# Altium footprint library main.PcbLib: 208 footprints (part 5 of 13)
Each footprint in its own frame and in the unit in brackets; x right, y up, seen from the top. Pads: shape width x height; smd on the part's side, far side on the other; paste and mask are expansions set on the pad; w line width, h text height; cw(c..) or ccw(c..) is an arc to the next point about the centre after c.
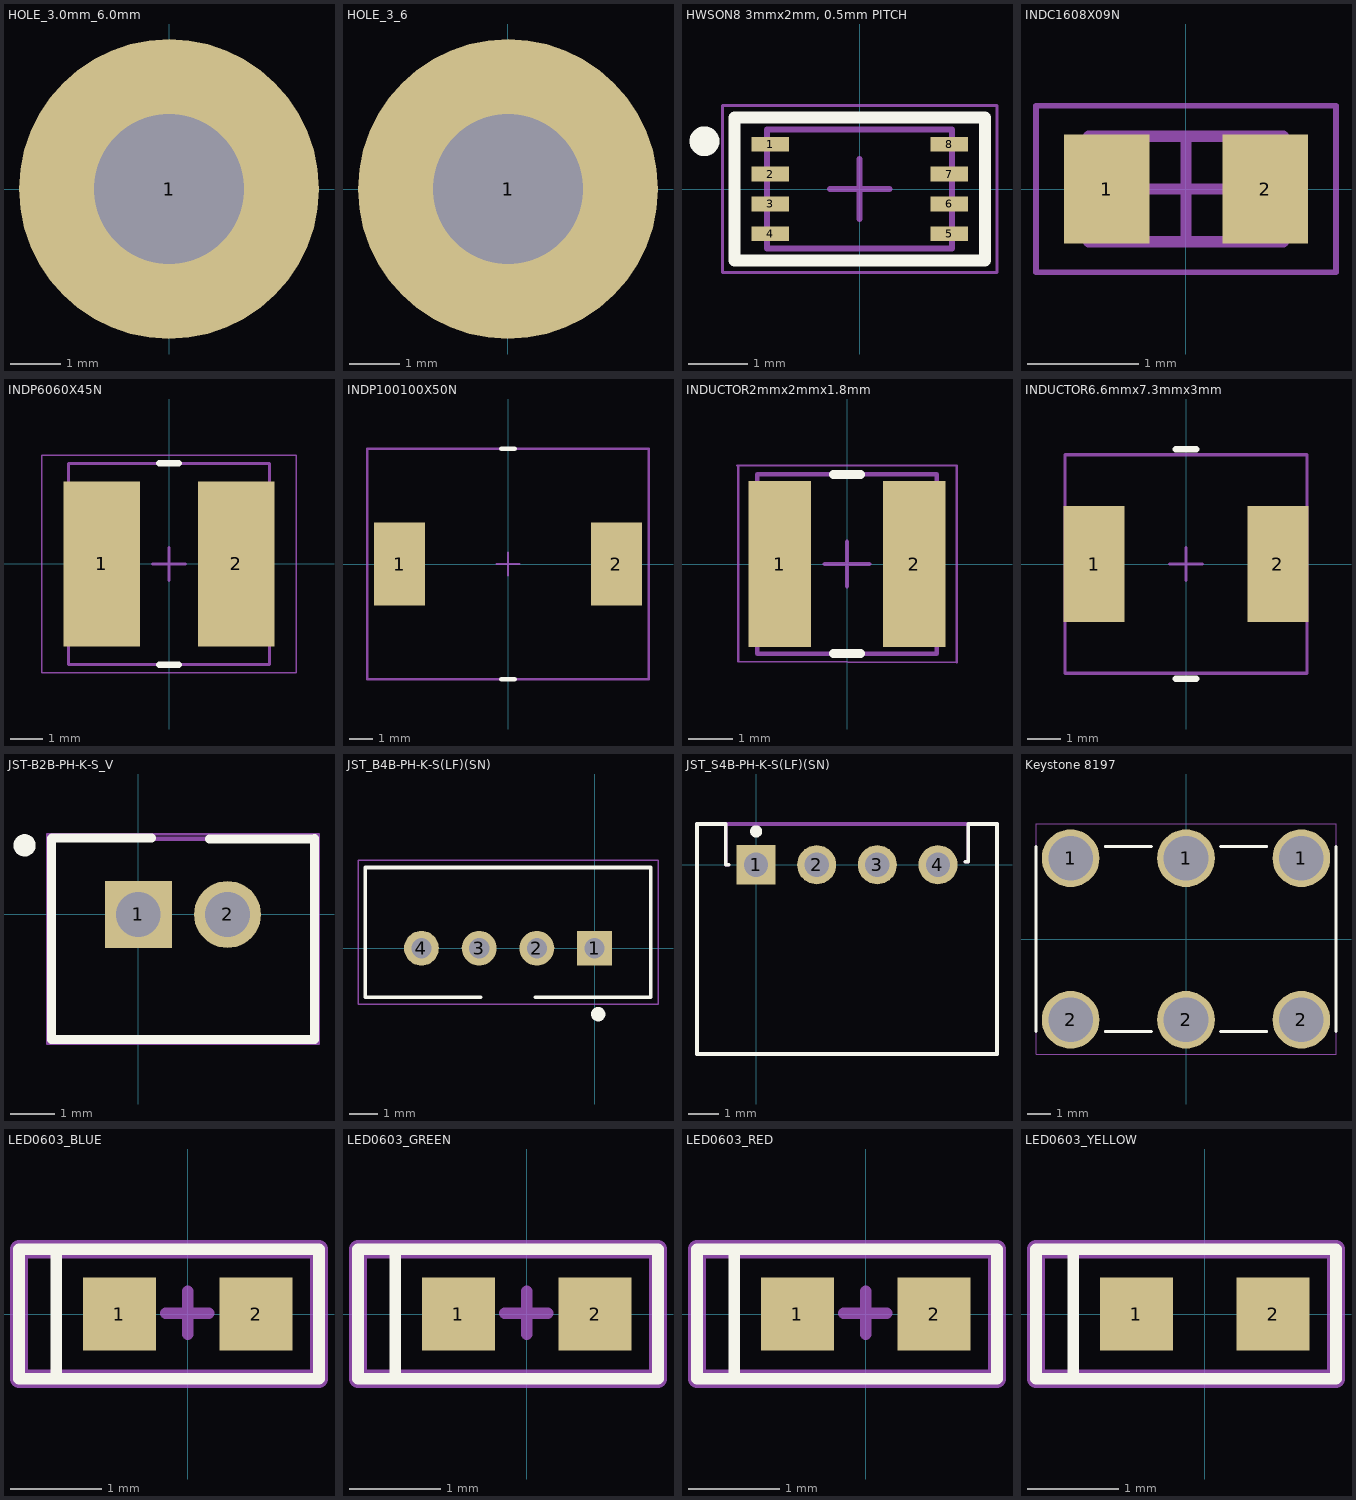
[diagram p4: the footprints below, top view; thin cyan lines are the x and y axes]

## HOLE_3.0mm_6.0mm [mm] "Plated M3 mounting hole"
pads (1):
  round 6 hole 3: 1(0,0)

## HOLE_3_6 [mm] "3 ID / 6 OD"
pads (1):
  round 6 hole 3: 1(0,0)

## HWSON8 3mmx2mm, 0.5mm PITCH [mm] "HWSON8 3mmx2mm, 0.5mm PITCH"
height 1.1
pads (8):
  rect 0.625x0.25 smd: 1(-1.5,0.75) 2(-1.5,0.25) 3(-1.5,-0.25) 4(-1.5,-0.75) 5(1.5,-0.75) 6(1.5,-0.25) 7(1.5,0.25) 8(1.5,0.75)
Top Overlay:
  circle w0.25: c-2.6,0.8 r0.125
  lines w0.2: -2.1,-1.2 2.1,-1.2 2.1,1.2 -2.1,1.2 -2.1,-1.2
Mechanical 7:
  text ".Designator" at -1.7,-0.7 h1.52
Mechanical 13:
  lines w0.1: -1.55,-1 1.55,-1 1.55,1 -1.55,1 -1.55,-1
Mechanical 15:
  lines w0.05: -2.3,-1.4 2.3,-1.4 2.3,1.4 -2.3,1.4 -2.3,-1.4
  lines w0.1: -0.5,0 0.5,0 ; 0,-0.5 0,0.5
3D body "User Library-HWSON8-2x3x0_80.STEP": height 0.75, standoff -0.05, extent -1.5,-1 1.5,1

## INDC1608X09N [mm] "Chip Inductor, 2-Leads, Body 1.60x0.80mm, IPC Medium Density"
height 0.95
pads (2):
  rect 0.77x0.98 smd: 1(-0.715,0) 2(0.715,0)
Mechanical 7:
  text ".Designator" at -1.15,-0.4 h1
Mechanical 13:
  lines w0.1: -0.875,-0.475 0.875,-0.475 0.875,0.475 -0.875,0.475 -0.875,-0.475
Mechanical 15:
  lines w0.05: -1.35,-0.75 1.35,-0.75 1.35,0.75 -1.35,0.75 -1.35,-0.75
  lines w0.1: -0.475,0 0.475,0 ; 0,-0.475 0,0.475
3D body: height 0.95, standoff 0, extent 0.575,-0.475 0.875,0.475
3D body: height 0.95, standoff 0, extent -0.875,-0.475 -0.575,0.475
3D body: height 0.95, standoff 0, extent -0.575,-0.475 0.575,0.475

## INDP6060X45N [mm] "Precision Wire Wound Inductor, 2-Leads, Body 6.00x6.00mm, IPC Medium Density"
height 4.5
pads (2):
  rect 2.35x5.1 smd: 1(-2.075,0) 2(2.075,0)
Top Overlay:
  lines w0.2: -0.3,-3.1 0.3,-3.1 ; -0.3,3.1 0.3,3.1
Mechanical 7:
  text ".Designator" at -2.126,-0.475 h1.52
Mechanical 13:
  lines w0.1: -3.1,-3.1 3.1,-3.1 3.1,3.1 -3.1,3.1 -3.1,-3.1
Mechanical 15:
  lines w0.05: -3.925,-3.35 3.925,-3.35 3.925,3.35 -3.925,3.35 -3.925,-3.35
  lines w0.1: -0.5,0 0.5,0 ; 0,-0.5 0,0.5
3D body "srn6045.stp": height 4.5, standoff 0, extent -3,-3 3,3

## INDP100100X50N [mm] "Precision Wire Wound Inductor, 2-Leads, Body 10.00x10.00mm, IPC Medium Density"
height 5.1
pads (2):
  rect 2.2x3.6 smd: 1(-4.7,0) 2(4.7,0)
Top Overlay:
  lines w0.2: -0.3,-5 0.3,-5 ; -0.3,5 0.3,5
Mechanical 7:
  text ".Designator" at -2.126,-0.475 h1.52
Mechanical 13:
  lines w0.1: -6.1,-5 -6.1,5 6.1,5 6.1,-5 -6.1,-5
Mechanical 15:
  lines w0.05: -6.1,-5 -6.1,5 6.1,5 6.1,-5 -6.1,-5
  lines w0.1: -0.5,0 0.5,0 ; 0,-0.5 0,0.5
3D body "sru1048.stp": height 4.6, standoff -0.2, extent -5,-5 5,5

## INDUCTOR2mmx2mmx1.8mm [mm] "INDUCTOR2mmx2mmx1.8mm"
height 1.8
pads (2):
  rect 1.4x3.7 smd: 1(-1.5,0) 2(1.5,0)
Top Overlay:
  lines w0.2: -0.3,-2 0.3,-2 ; -0.3,2 0.3,2
Mechanical 7:
  text ".Designator" at -2.126,-0.475 h1.52
Mechanical 13:
  lines w0.1: 1.99,-2 -2,-2 -2,2 1.99,2 ; 2,-2 2,2
Mechanical 15:
  lines w0.05: -2.45,2.2 2.45,2.2 2.45,-2.2 -2.43,-2.18 -2.43,2.2
  lines w0.1: -0.5,0 0.5,0 ; 0,-0.5 0,0.5
3D body: height 1.8, standoff 0, extent -2,-2 2,2

## INDUCTOR6.6mmx7.3mmx3mm [mm] "INDUCTOR6.6mmx7.3mmx3mm"
height 3
pads (2):
  rect 1.85x3.5 smd: 1(-2.775,0) 2(2.775,0)
Top Overlay:
  lines w0.2: -0.3,-3.46 0.3,-3.46 ; -0.3,3.46 0.3,3.46
Mechanical 7:
  text ".Designator" at -1.57,-0.58 h1.52
Mechanical 13:
  lines w0.1: -3.65,-3.3 3.65,-3.3 3.65,3.3 -3.65,3.3 -3.65,-3.3
Mechanical 15:
  lines w0.05: -3.65,-3.3 3.65,-3.3 3.65,3.3 -3.65,3.3 -3.65,-3.3
  lines w0.1: -0.5,0 0.5,0 ; 0,-0.5 0,0.5
3D body: height 3, standoff 0, extent -3.65,-3.3 3.65,3.3

## JST-B2B-PH-K-S_V [mm] "Connector, 2-Leads, Body 5.9x4.5mm, Pitch 2mm"
height 6
pads (2):
  rect 1.5x1.5 hole 1: 1(0,0)
  round 1.5 hole 1: 2(2,0)
Top Overlay:
  circle w0.25: c-2.55,1.55 r0.125
  lines w0.2: -1.95,1.7 -1.95,-2.8 3.95,-2.8 3.95,1.7 ; -1.941,1.71 0.3,1.71 ; 1.6,1.692 3.929,1.692
Mechanical 7:
  text ".Designator" at -1.417,-1.899 h1.52
Mechanical 13:
  lines w0.1: -1.95,-2.8 -1.95,1.7 3.95,1.7 3.95,-2.8 -1.95,-2.8
Mechanical 15:
  lines w0.05: -2.05,-2.9 -2.05,1.8 4.05,1.8 4.05,-2.9 -2.05,-2.9
3D body "B2B-PH-K-S(LF)(SN)--3DModel-STEP-56544.STEP": height 6.05, standoff -3.35, extent -1.979,-2.8 3.921,1.7
3D body: height 0, standoff -3.4, extent -0.249,-0.249 0.249,0.249
3D body: height 0, standoff -3.4, extent 1.75,-0.249 2.249,0.25
3D body: height 0.25, standoff 0, extent -2.683,0.212 -2.683,0.212

## JST_B4B-PH-K-S(LF)(SN) [mm]
pads (4):
  rect 1.208x1.208 hole 0.7: 1(0,0)
  round 1.208 hole 0.7: 2(-2,0) 3(-4,0) 4(-6,0)
Top Overlay:
  circle w0.25: c0.127,-2.286 r0.125
  lines w0.127: -3.95,-1.7 -7.95,-1.7 -7.95,2.8 1.95,2.8 1.95,-1.7 -2.05,-1.7
Mechanical 7:
  text ".Designator" at -5.548,-1.037 h1.52
Mechanical 15:
  lines w0.05: -8.2,-1.95 -8.2,3.05 2.2,3.05 2.2,-1.95 -8.2,-1.95
3D body "B4B-PH-K-S(LF)(SN)--3DModel-STEP-56544.STEP": height 6, standoff -3.4, extent -7.95,-1.736 1.95,2.764

## JST_S4B-PH-K-S(LF)(SN) [mm]
height 1.8
pads (4):
  rect 1.29x1.29 hole 0.8: 1(0,0)
  round 1.29 hole 0.8: 2(2,0) 3(4,0) 4(6,0)
Top Overlay:
  circle w0.2: c0,1.1 r0.1
  lines w0.127: -0.9,0 -1,0 -1,1.35 -1.95,1.35 -1.95,-6.25 7.95,-6.25 7.95,1.35 7,1.35 7,0.1 6.9,0.1
Mechanical 7:
  text ".Designator" at -1.195,-4.27 h1.52
Mechanical 15:
  lines w0.127: -0.9,0 -1,0 -1,1.35 -1.95,1.35 ; 6.9,0.1 7,0.1 7,1.35 7.95,1.35 ; -1.95,1.35 7.95,1.35 ; -1.95,1.35 -1.95,-6.25 7.95,-6.25 7.95,1.35
3D body "S4B-PH-K-S.STEP": height 4.9, standoff -3.3, extent -2.025,-6.25 7.875,1.35

## Keystone 8197 [mm] "Keystone 8197"
pads (6):
  round 2.5 hole 1.93: 1(-5,3.5) 1(0,3.5) 1(5,3.5) 2(-5,-3.5) 2(0,-3.5) 2(5,-3.5)
Top Overlay:
  lines w0.127: -6.5,-4 -6.5,4 ; -3.5,-4 -1.5,-4 ; -3.5,4 -1.5,4 ; 1.5,-4 3.5,-4 ; 1.5,4 3.5,4 ; 6.5,-4 6.5,4
Mechanical 7:
  text ".Designator" at -4,-0.5 h0.76
Mechanical 15:
  lines w0.05: -6.5,-5 -6.5,5 6.5,5 6.5,-5 -6.5,-5
3D body "keystone-PN7786.STEP": height 6.68, standoff -5, extent -6.439,-4.516 6.439,4.5

## LED0603_BLUE [mm] "LED0603_BLUE"
height 0.65
pads (2):
  rect 0.8x0.8 smd: 1(-0.75,0) 2(0.75,0)
Top Overlay:
  lines w0.127: -1.44,-0.7 -1.44,0.7 ; -1.85,-0.71 -1.85,0.71 1.44,0.71 1.44,-0.71 -1.85,-0.71
Mechanical 7:
  text ".Designator" at -1.424,-0.258 h0.76
Mechanical 15:
  lines w0.127: -0.24,0.01 0.23,0.01 ; 0,-0.22 0,0.25
  lines w0.2: -1.85,-0.71 1.44,-0.71 1.44,0.71 -1.85,0.71 -1.85,-0.71
3D body "sml-310vtt86.stp": height 0.8, standoff 0, extent -0.8,-0.4 0.8,0.4

## LED0603_GREEN [mm] "LED0603_GREEN"
height 0.65
pads (2):
  rect 0.8x0.8 smd: 1(-0.75,0) 2(0.75,0)
Top Overlay:
  lines w0.127: -1.44,-0.7 -1.44,0.7 ; -1.85,-0.71 1.44,-0.71 1.44,0.71 -1.85,0.71 -1.85,-0.71
Mechanical 7:
  text ".Designator" at -1.424,-0.258 h0.76
Mechanical 15:
  lines w0.127: -0.24,0.01 0.23,0.01 ; 0,-0.22 0,0.25
  lines w0.2: -1.85,-0.71 -1.85,0.71 1.44,0.71 1.44,-0.71 -1.85,-0.71
3D body "User Library-LED_0603_G.STEP": height 0.6, standoff 0, extent -0.8,-0.4 0.8,0.4

## LED0603_RED [mm] "LED0603_RED"
height 0.65
pads (2):
  rect 0.8x0.8 smd: 1(-0.75,0) 2(0.75,0)
Top Overlay:
  lines w0.127: -1.44,-0.7 -1.44,0.7 ; -1.85,-0.71 1.44,-0.71 1.44,0.71 -1.85,0.71 -1.85,-0.71
Mechanical 7:
  text ".Designator" at -1.424,-0.258 h0.76
Mechanical 15:
  lines w0.127: -0.24,0.01 0.23,0.01 ; 0,-0.22 0,0.25
  lines w0.2: -1.85,-0.71 -1.85,0.71 1.44,0.71 1.44,-0.71 -1.85,-0.71
3D body "User Library-LED_0603_R.STEP": height 0.6, standoff 0, extent -0.8,-0.4 0.8,0.4

## LED0603_YELLOW [mm] "LED0603_YELLOW"
height 0.65
pads (2):
  rect 0.8x0.8 smd: 1(-0.75,0) 2(0.75,0)
Top Overlay:
  lines w0.127: -1.44,-0.7 -1.44,0.7 ; -1.85,-0.71 -1.85,0.71 1.44,0.71 1.44,-0.71 -1.85,-0.71
Mechanical 7:
  text ".Designator" at -1.424,-0.258 h0.76
Mechanical 15:
  lines w0.2: -1.85,-0.71 1.44,-0.71 1.44,0.71 -1.85,0.71 -1.85,-0.71
3D body "ALSRobot-LED0603(Y).STEP": height 0.6, standoff 0, extent -0.81,-0.4 0.81,0.4